# Altium footprint library chenjd.PcbLib: 87 footprints (part 3 of 6)
Each footprint in its own frame and in the unit in brackets; x right, y up, seen from the top. Pads: shape width x height; smd on the part's side, far side on the other; paste and mask are expansions set on the pad; w line width, h text height; cw(c..) or ccw(c..) is an arc to the next point about the centre after c.
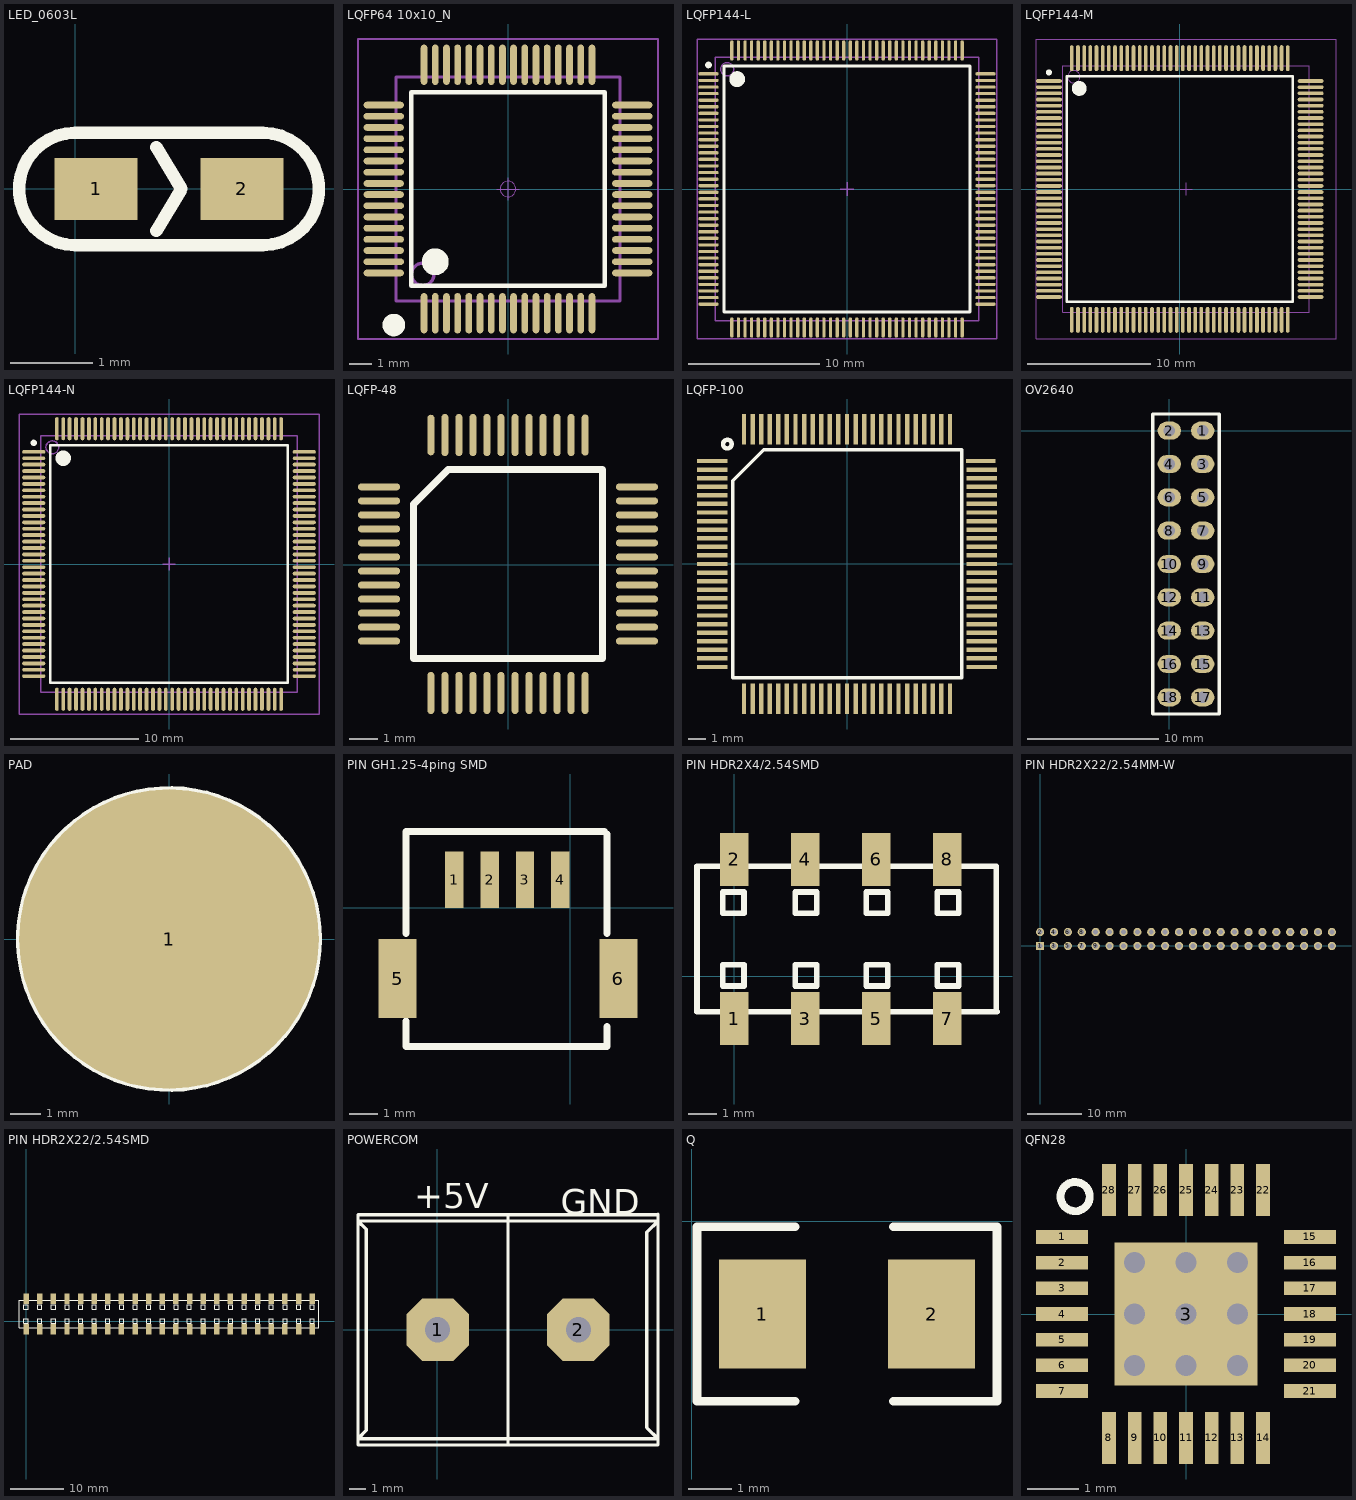
[diagram p2: the footprints below, top view; thin cyan lines are the x and y axes]

## LED_0603L [mil] "LED"
pads (2):
  rect 40x30 smd: 1(10,0) 2(80,0)
Top Overlay:
  lines w6: 39,-20 51,0 39,20 ; 0,-27 cw(c0,0) 0,27 90,27 cw(c90,0) 90,-27 0,-27
3D body "LED_0603_R.STEP": height 23.62, standoff -0.08, extent 13.51,-15.74 76.5,15.75

## LQFP64 10x10_N [mm] "64脚，体宽10x10mm，脚距0.5mm"
height 1.6
pads (64):
  oval 0.3x1.8 smd: 1(-3.75,-5.55) 2(-3.25,-5.55) 3(-2.75,-5.55) 4(-2.25,-5.55) 5(-1.75,-5.55) 6(-1.25,-5.55) 7(-0.75,-5.55) 8(-0.25,-5.55) 9(0.25,-5.55) 10(0.75,-5.55) 11(1.25,-5.55) 12(1.75,-5.55) 13(2.25,-5.55) 14(2.75,-5.55) 15(3.25,-5.55) 16(3.75,-5.55) 33(3.75,5.55) 34(3.25,5.55) 35(2.75,5.55) 36(2.25,5.55) 37(1.75,5.55) 38(1.25,5.55) 39(0.75,5.55) 40(0.25,5.55) 41(-0.25,5.55) 42(-0.75,5.55) 43(-1.25,5.55) 44(-1.75,5.55) 45(-2.25,5.55) 46(-2.75,5.55) 47(-3.25,5.55) 48(-3.75,5.55)
  oval 1.8x0.3 smd: 17(5.55,-3.75) 18(5.55,-3.25) 19(5.55,-2.75) 20(5.55,-2.25) 21(5.55,-1.75) 22(5.55,-1.25) 23(5.55,-0.75) 24(5.55,-0.25) 25(5.55,0.25) 26(5.55,0.75) 27(5.55,1.25) 28(5.55,1.75) 29(5.55,2.25) 30(5.55,2.75) 31(5.55,3.25) 32(5.55,3.75) 49(-5.55,3.75) 50(-5.55,3.25) 51(-5.55,2.75) 52(-5.55,2.25) 53(-5.55,1.75) 54(-5.55,1.25) 55(-5.55,0.75) 56(-5.55,0.25) 57(-5.55,-0.25) 58(-5.55,-0.75) 59(-5.55,-1.25) 60(-5.55,-1.75) 61(-5.55,-2.25) 62(-5.55,-2.75) 63(-5.55,-3.25) 64(-5.55,-3.75)
Top Overlay:
  circle w0.6: c-3.25,-3.25 r0.3
  circle w0.508: c-5.1,-6.076 r0.25
  lines w0.2: -4.318,-4.318 4.318,-4.318 4.318,4.318 -4.318,4.318 -4.318,-4.318
Mechanical 13:
  circle w0.15: c-3.81,-3.81 r0.5
  lines w0.15: -5,-5 -5,5 5,5 5,-5 -5,-5
Mechanical 15:
  circle w0.05: c0,0 r0.35
  lines w0.05: -0.5,0 0.5,0 ; 0,-0.5 0,0.5
  lines w0.1: -6.7,-6.7 6.7,-6.7 6.7,6.7 -6.7,6.7 -6.7,-6.7
3D body "LQFP64-10x10.STEP": height 1.45, standoff 0, extent -6,-6 6,6

## LQFP144-L [mm]
pads (144):
  oval 1.55x0.25 smd: 1(-10.525,8.75) 2(-10.525,8.25) 3(-10.525,7.75) 4(-10.525,7.25) 5(-10.525,6.75) 6(-10.525,6.25) 7(-10.525,5.75) 8(-10.525,5.25) 9(-10.525,4.75) 10(-10.525,4.25) 11(-10.525,3.75) 12(-10.525,3.25) 13(-10.525,2.75) 14(-10.525,2.25) 15(-10.525,1.75) 16(-10.525,1.25) 17(-10.525,0.75) 18(-10.525,0.25) 19(-10.525,-0.25) 20(-10.525,-0.75) 21(-10.525,-1.25) 22(-10.525,-1.75) 23(-10.525,-2.25) 24(-10.525,-2.75) 25(-10.525,-3.25) 26(-10.525,-3.75) 27(-10.525,-4.25) 28(-10.525,-4.75) 29(-10.525,-5.25) 30(-10.525,-5.75) 31(-10.525,-6.25) 32(-10.525,-6.75) 33(-10.525,-7.25) 34(-10.525,-7.75) 35(-10.525,-8.25) 36(-10.525,-8.75) 73(10.525,-8.75) 74(10.525,-8.25) 75(10.525,-7.75) 76(10.525,-7.25) 77(10.525,-6.75) 78(10.525,-6.25) 79(10.525,-5.75) 80(10.525,-5.25) 81(10.525,-4.75) 82(10.525,-4.25) 83(10.525,-3.75) 84(10.525,-3.25) 85(10.525,-2.75) 86(10.525,-2.25) 87(10.525,-1.75) 88(10.525,-1.25) 89(10.525,-0.75) 90(10.525,-0.25) 91(10.525,0.25) 92(10.525,0.75) 93(10.525,1.25) 94(10.525,1.75) 95(10.525,2.25) 96(10.525,2.75) 97(10.525,3.25) 98(10.525,3.75) 99(10.525,4.25) 100(10.525,4.75) 101(10.525,5.25) 102(10.525,5.75) 103(10.525,6.25) 104(10.525,6.75) 105(10.525,7.25) 106(10.525,7.75) 107(10.525,8.25) 108(10.525,8.75)
  oval 0.25x1.55 smd: 37(-8.75,-10.525) 38(-8.25,-10.525) 39(-7.75,-10.525) 40(-7.25,-10.525) 41(-6.75,-10.525) 42(-6.25,-10.525) 43(-5.75,-10.525) 44(-5.25,-10.525) 45(-4.75,-10.525) 46(-4.25,-10.525) 47(-3.75,-10.525) 48(-3.25,-10.525) 49(-2.75,-10.525) 50(-2.25,-10.525) 51(-1.75,-10.525) 52(-1.25,-10.525) 53(-0.75,-10.525) 54(-0.25,-10.525) 55(0.25,-10.525) 56(0.75,-10.525) 57(1.25,-10.525) 58(1.75,-10.525) 59(2.25,-10.525) 60(2.75,-10.525) 61(3.25,-10.525) 62(3.75,-10.525) 63(4.25,-10.525) 64(4.75,-10.525) 65(5.25,-10.525) 66(5.75,-10.525) 67(6.25,-10.525) 68(6.75,-10.525) 69(7.25,-10.525) 70(7.75,-10.525) 71(8.25,-10.525) 72(8.75,-10.525) 109(8.75,10.525) 110(8.25,10.525) 111(7.75,10.525) 112(7.25,10.525) 113(6.75,10.525) 114(6.25,10.525) 115(5.75,10.525) 116(5.25,10.525) 117(4.75,10.525) 118(4.25,10.525) 119(3.75,10.525) 120(3.25,10.525) 121(2.75,10.525) 122(2.25,10.525) 123(1.75,10.525) 124(1.25,10.525) 125(0.75,10.525) 126(0.25,10.525) 127(-0.25,10.525) 128(-0.75,10.525) 129(-1.25,10.525) 130(-1.75,10.525) 131(-2.25,10.525) 132(-2.75,10.525) 133(-3.25,10.525) 134(-3.75,10.525) 135(-4.25,10.525) 136(-4.75,10.525) 137(-5.25,10.525) 138(-5.75,10.525) 139(-6.25,10.525) 140(-6.75,10.525) 141(-7.25,10.525) 142(-7.75,10.525) 143(-8.25,10.525) 144(-8.75,10.525)
Top Overlay:
  circle w0.25: c-10.525,9.425 r0.125
  circle w0.6: c-8.35,8.35 r0.3
  lines w0.2: -9.35,-9.35 -9.35,9.35 9.35,9.35 9.35,-9.35 -9.35,-9.35
Mechanical 13:
  circle w0.1: c-9.1,9.1 r0.5
  lines w0.1: -10,-10 -10,10 10,10 10,-10 -10,-10
Mechanical 15:
  lines w0.1: -0.5,0 0.5,0 ; 0,-0.5 0,0.5 ; -11.4,-11.4 -11.4,11.4 11.4,11.4 11.4,-11.4 -11.4,-11.4

## LQFP144-M [mm]
pads (144):
  oval 2.1x0.3 smd: 1(-10.6,8.75) 2(-10.6,8.25) 3(-10.6,7.75) 4(-10.6,7.25) 5(-10.6,6.75) 6(-10.6,6.25) 7(-10.6,5.75) 8(-10.6,5.25) 9(-10.6,4.75) 10(-10.6,4.25) 11(-10.6,3.75) 12(-10.6,3.25) 13(-10.6,2.75) 14(-10.6,2.25) 15(-10.6,1.75) 16(-10.6,1.25) 17(-10.6,0.75) 18(-10.6,0.25) 19(-10.6,-0.25) 20(-10.6,-0.75) 21(-10.6,-1.25) 22(-10.6,-1.75) 23(-10.6,-2.25) 24(-10.6,-2.75) 25(-10.6,-3.25) 26(-10.6,-3.75) 27(-10.6,-4.25) 28(-10.6,-4.75) 29(-10.6,-5.25) 30(-10.6,-5.75) 31(-10.6,-6.25) 32(-10.6,-6.75) 33(-10.6,-7.25) 34(-10.6,-7.75) 35(-10.6,-8.25) 36(-10.6,-8.75) 73(10.6,-8.75) 74(10.6,-8.25) 75(10.6,-7.75) 76(10.6,-7.25) 77(10.6,-6.75) 78(10.6,-6.25) 79(10.6,-5.75) 80(10.6,-5.25) 81(10.6,-4.75) 82(10.6,-4.25) 83(10.6,-3.75) 84(10.6,-3.25) 85(10.6,-2.75) 86(10.6,-2.25) 87(10.6,-1.75) 88(10.6,-1.25) 89(10.6,-0.75) 90(10.6,-0.25) 91(10.6,0.25) 92(10.6,0.75) 93(10.6,1.25) 94(10.6,1.75) 95(10.6,2.25) 96(10.6,2.75) 97(10.6,3.25) 98(10.6,3.75) 99(10.6,4.25) 100(10.6,4.75) 101(10.6,5.25) 102(10.6,5.75) 103(10.6,6.25) 104(10.6,6.75) 105(10.6,7.25) 106(10.6,7.75) 107(10.6,8.25) 108(10.6,8.75)
  oval 0.3x2.1 smd: 37(-8.75,-10.6) 38(-8.25,-10.6) 39(-7.75,-10.6) 40(-7.25,-10.6) 41(-6.75,-10.6) 42(-6.25,-10.6) 43(-5.75,-10.6) 44(-5.25,-10.6) 45(-4.75,-10.6) 46(-4.25,-10.6) 47(-3.75,-10.6) 48(-3.25,-10.6) 49(-2.75,-10.6) 50(-2.25,-10.6) 51(-1.75,-10.6) 52(-1.25,-10.6) 53(-0.75,-10.6) 54(-0.25,-10.6) 55(0.25,-10.6) 56(0.75,-10.6) 57(1.25,-10.6) 58(1.75,-10.6) 59(2.25,-10.6) 60(2.75,-10.6) 61(3.25,-10.6) 62(3.75,-10.6) 63(4.25,-10.6) 64(4.75,-10.6) 65(5.25,-10.6) 66(5.75,-10.6) 67(6.25,-10.6) 68(6.75,-10.6) 69(7.25,-10.6) 70(7.75,-10.6) 71(8.25,-10.6) 72(8.75,-10.6) 109(8.75,10.6) 110(8.25,10.6) 111(7.75,10.6) 112(7.25,10.6) 113(6.75,10.6) 114(6.25,10.6) 115(5.75,10.6) 116(5.25,10.6) 117(4.75,10.6) 118(4.25,10.6) 119(3.75,10.6) 120(3.25,10.6) 121(2.75,10.6) 122(2.25,10.6) 123(1.75,10.6) 124(1.25,10.6) 125(0.75,10.6) 126(0.25,10.6) 127(-0.25,10.6) 128(-0.75,10.6) 129(-1.25,10.6) 130(-1.75,10.6) 131(-2.25,10.6) 132(-2.75,10.6) 133(-3.25,10.6) 134(-3.75,10.6) 135(-4.25,10.6) 136(-4.75,10.6) 137(-5.25,10.6) 138(-5.75,10.6) 139(-6.25,10.6) 140(-6.75,10.6) 141(-7.25,10.6) 142(-7.75,10.6) 143(-8.25,10.6) 144(-8.75,10.6)
Top Overlay:
  circle w0.6: c-8.15,8.15 r0.3
  circle w0.25: c-10.6,9.45 r0.125
  lines w0.2: -9.15,-9.15 9.15,-9.15 9.15,9.15 -9.15,9.15 -9.15,-9.15
Mechanical 13:
  circle w0.1: c-8.592,9.1 r0.5
  lines w0.1: -9.492,-10 10.508,-10 10.508,10 -9.492,10 -9.492,-10
Mechanical 15:
  lines w0.1: 0.008,0 1.008,0 ; 0.508,-0.5 0.508,0.5 ; -11.642,-12.15 12.658,-12.15 12.658,12.15 -11.642,12.15 -11.642,-12.15

## LQFP144-N [mm]
pads (144):
  oval 1.8x0.3 smd: 1(-10.55,8.75) 2(-10.55,8.25) 3(-10.55,7.75) 4(-10.55,7.25) 5(-10.55,6.75) 6(-10.55,6.25) 7(-10.55,5.75) 8(-10.55,5.25) 9(-10.55,4.75) 10(-10.55,4.25) 11(-10.55,3.75) 12(-10.55,3.25) 13(-10.55,2.75) 14(-10.55,2.25) 15(-10.55,1.75) 16(-10.55,1.25) 17(-10.55,0.75) 18(-10.55,0.25) 19(-10.55,-0.25) 20(-10.55,-0.75) 21(-10.55,-1.25) 22(-10.55,-1.75) 23(-10.55,-2.25) 24(-10.55,-2.75) 25(-10.55,-3.25) 26(-10.55,-3.75) 27(-10.55,-4.25) 28(-10.55,-4.75) 29(-10.55,-5.25) 30(-10.55,-5.75) 31(-10.55,-6.25) 32(-10.55,-6.75) 33(-10.55,-7.25) 34(-10.55,-7.75) 35(-10.55,-8.25) 36(-10.55,-8.75) 73(10.55,-8.75) 74(10.55,-8.25) 75(10.55,-7.75) 76(10.55,-7.25) 77(10.55,-6.75) 78(10.55,-6.25) 79(10.55,-5.75) 80(10.55,-5.25) 81(10.55,-4.75) 82(10.55,-4.25) 83(10.55,-3.75) 84(10.55,-3.25) 85(10.55,-2.75) 86(10.55,-2.25) 87(10.55,-1.75) 88(10.55,-1.25) 89(10.55,-0.75) 90(10.55,-0.25) 91(10.55,0.25) 92(10.55,0.75) 93(10.55,1.25) 94(10.55,1.75) 95(10.55,2.25) 96(10.55,2.75) 97(10.55,3.25) 98(10.55,3.75) 99(10.55,4.25) 100(10.55,4.75) 101(10.55,5.25) 102(10.55,5.75) 103(10.55,6.25) 104(10.55,6.75) 105(10.55,7.25) 106(10.55,7.75) 107(10.55,8.25) 108(10.55,8.75)
  oval 0.3x1.8 smd: 37(-8.75,-10.55) 38(-8.25,-10.55) 39(-7.75,-10.55) 40(-7.25,-10.55) 41(-6.75,-10.55) 42(-6.25,-10.55) 43(-5.75,-10.55) 44(-5.25,-10.55) 45(-4.75,-10.55) 46(-4.25,-10.55) 47(-3.75,-10.55) 48(-3.25,-10.55) 49(-2.75,-10.55) 50(-2.25,-10.55) 51(-1.75,-10.55) 52(-1.25,-10.55) 53(-0.75,-10.55) 54(-0.25,-10.55) 55(0.25,-10.55) 56(0.75,-10.55) 57(1.25,-10.55) 58(1.75,-10.55) 59(2.25,-10.55) 60(2.75,-10.55) 61(3.25,-10.55) 62(3.75,-10.55) 63(4.25,-10.55) 64(4.75,-10.55) 65(5.25,-10.55) 66(5.75,-10.55) 67(6.25,-10.55) 68(6.75,-10.55) 69(7.25,-10.55) 70(7.75,-10.55) 71(8.25,-10.55) 72(8.75,-10.55) 109(8.75,10.55) 110(8.25,10.55) 111(7.75,10.55) 112(7.25,10.55) 113(6.75,10.55) 114(6.25,10.55) 115(5.75,10.55) 116(5.25,10.55) 117(4.75,10.55) 118(4.25,10.55) 119(3.75,10.55) 120(3.25,10.55) 121(2.75,10.55) 122(2.25,10.55) 123(1.75,10.55) 124(1.25,10.55) 125(0.75,10.55) 126(0.25,10.55) 127(-0.25,10.55) 128(-0.75,10.55) 129(-1.25,10.55) 130(-1.75,10.55) 131(-2.25,10.55) 132(-2.75,10.55) 133(-3.25,10.55) 134(-3.75,10.55) 135(-4.25,10.55) 136(-4.75,10.55) 137(-5.25,10.55) 138(-5.75,10.55) 139(-6.25,10.55) 140(-6.75,10.55) 141(-7.25,10.55) 142(-7.75,10.55) 143(-8.25,10.55) 144(-8.75,10.55)
Top Overlay:
  circle w0.6: c-8.25,8.25 r0.3
  circle w0.25: c-10.55,9.45 r0.125
  lines w0.2: -9.25,-9.25 9.25,-9.25 9.25,9.25 -9.25,9.25 -9.25,-9.25
Mechanical 13:
  circle w0.1: c-9.1,9.1 r0.5
  lines w0.1: -10,-10 10,-10 10,10 -10,10 -10,-10
Mechanical 15:
  lines w0.1: -0.5,0 0.5,0 ; 0,-0.5 0,0.5 ; -11.7,-11.7 11.7,-11.7 11.7,11.7 -11.7,11.7 -11.7,-11.7

## LQFP-48 [mm] "GD105"
pads (48):
  oval 1.5x0.25 smd: 1(-4.6,2.773) 2(-4.6,2.273) 3(-4.6,1.773) 4(-4.6,1.273) 5(-4.6,0.773) 6(-4.6,0.273) 7(-4.6,-0.227) 8(-4.6,-0.727) 9(-4.6,-1.227) 10(-4.6,-1.727) 11(-4.6,-2.227) 12(-4.6,-2.727) 25(4.6,-2.727) 26(4.6,-2.227) 27(4.6,-1.727) 28(4.6,-1.227) 29(4.6,-0.727) 30(4.6,-0.227) 31(4.6,0.273) 32(4.6,0.773) 33(4.6,1.273) 34(4.6,1.773) 35(4.6,2.273) 36(4.6,2.773)
  oval 0.25x1.5 smd: 13(-2.75,-4.577) 14(-2.25,-4.577) 15(-1.75,-4.577) 16(-1.25,-4.577) 17(-0.75,-4.577) 18(-0.25,-4.577) 19(0.25,-4.577) 20(0.75,-4.577) 21(1.25,-4.577) 22(1.75,-4.577) 23(2.25,-4.577) 24(2.75,-4.577) 38(2.25,4.623) 39(1.75,4.623) 40(1.25,4.623) 41(0.75,4.623) 42(0.25,4.623) 43(-0.25,4.623) 44(-0.75,4.623) 45(-1.25,4.623) 46(-1.75,4.623) 47(-2.25,4.623)
  oval 0.25x1.473 smd: 37(2.75,4.623)
  oval 0.25x1.448 smd: 48(-2.75,4.623)
Top Overlay:
  lines w0.254: -3.365,-3.342 -3.365,2.153 -2.13,3.388 3.365,3.388 3.365,-3.342 -3.365,-3.342
3D body "LQFP48-7x7.STEP": height 1.45, standoff 0, extent -4.5,-4.5 4.5,4.5

## LQFP-100 [mil]
pads (100):
  rect 70x10 smd: 1(-309.5,236.22) 2(-309.5,216.53) 3(-309.5,196.85) 4(-309.5,177.16) 5(-309.5,157.48) 6(-309.5,137.79) 7(-309.5,118.11) 8(-309.5,98.42) 9(-309.5,78.74) 10(-309.5,59.05) 11(-309.5,39.37) 12(-309.5,19.68) 13(-309.5,0) 14(-309.5,-19.69) 15(-309.5,-39.37) 16(-309.5,-59.06) 17(-309.5,-78.74) 18(-309.5,-98.43) 19(-309.5,-118.11) 20(-309.5,-137.8) 21(-309.5,-157.48) 22(-309.5,-177.17) 23(-309.5,-196.85) 24(-309.5,-216.54) 25(-309.5,-236.22) 51(308.61,-236.22) 52(308.61,-216.54) 53(308.61,-196.85) 54(308.61,-177.17) 55(308.61,-157.48) 56(308.61,-137.8) 57(308.61,-118.11) 58(308.61,-98.43) 59(308.61,-78.74) 60(308.61,-59.06) 61(308.61,-39.37) 62(308.61,-19.69) 63(308.61,0) 64(308.61,19.68) 65(308.61,39.37) 66(308.61,59.05) 67(308.61,78.74) 68(308.61,98.42) 69(308.61,118.11) 70(308.61,137.79) 71(308.61,157.48) 72(308.61,177.16) 73(308.61,196.85) 74(308.61,216.53)
  rect 10x70 smd: 26(-236.67,-309.06) 27(-216.98,-309.06) 28(-197.29,-309.06) 29(-177.61,-309.06) 30(-157.93,-309.06) 31(-138.24,-309.06) 32(-118.56,-309.06) 33(-98.87,-309.06) 34(-79.19,-309.06) 35(-59.5,-309.06) 36(-39.81,-309.06) 37(-20.13,-309.06) 38(-0.45,-309.06) 39(19.24,-309.06) 40(38.92,-309.06) 41(58.61,-309.06) 42(78.3,-309.06) 43(97.98,-309.06) 44(117.67,-309.06) 45(137.35,-309.06) 46(157.03,-309.06) 47(176.72,-309.06) 48(196.41,-309.06) 49(216.09,-309.06) 50(235.78,-309.06) 76(235.78,309.05) 77(216.09,309.05) 78(196.41,309.05) 79(176.72,309.05) 80(157.04,309.05) 81(137.35,309.05) 82(117.67,309.05) 83(97.98,309.05) 84(78.3,309.05) 85(58.61,309.05) 86(38.93,309.05) 87(19.24,309.05) 88(-0.44,309.05) 89(-20.13,309.05) 90(-39.81,309.05) 91(-59.5,309.05) 92(-79.18,309.05) 93(-98.87,309.05) 94(-118.55,309.05) 95(-138.24,309.05) 96(-157.93,309.05) 97(-177.61,309.05) 98(-197.29,309.05) 99(-216.98,309.05) 100(-236.66,309.05)
  rect 68x10 smd: 75(306.61,236.22)
Top Overlay:
  circle w10: c-275,275 r10
  lines w8: -262.26,191.22 -262.26,-260.95 263.02,-260.95 263.02,261.81 -191.5,261.81 -262.09,191.22
3D body "LQFP100 14x14.STEP": height 57.09, standoff 0.03, extent -315.52,-321.09 314.63,309.05

## OV2640 [mil] "CAMERA接口"
pads (18):
  oval 70x54 hole 35: 1(99.66,0.01) 2(-0.34,0.01) 3(99.66,-99.99) 4(-0.34,-99.99) 5(99.66,-199.99) 6(-0.34,-199.99) 7(99.66,-299.99) 8(-0.34,-299.99) 9(99.66,-399.99) 10(-0.34,-399.99) 11(99.66,-499.99) 12(-0.34,-499.99) 13(99.66,-599.99) 14(-0.34,-599.99) 15(99.66,-699.99) 16(-0.34,-699.99) 17(99.66,-799.99) 18(-0.34,-799.99)
Top Overlay:
  lines w10: -50.34,-849.99 -50.34,50.01 149.66,50.01 149.66,-849.99 -50.34,-849.99
3D body "4PIN--yellow.STEP": height 452.76, standoff -118.11, extent 49.66,-350 149.66,50
3D body "4PIN--yellow.STEP": height 452.76, standoff -118.11, extent 49.66,-750 149.66,-350
3D body "4PIN--yellow.STEP": height 452.76, standoff -118.11, extent -50.34,-350 49.66,50
3D body "4PIN--yellow.STEP": height 452.76, standoff -118.11, extent -50.34,-750 49.66,-350

## PAD [mm] "触摸"
pads (1):
  round 10 smd: 1(0,0)
Top Overlay:
  circle w0.2: c0,0 r5

## PIN GH1.25-4ping SMD [mm] "GH1.25 4pin"
pads (6):
  rect 0.65x2 smd: 1(-4.1,1) 2(-2.85,1) 3(-1.6,1) 4(-0.35,1)
  rect 1.35x2.8 smd: 5(-6.1,-2.5) 6(1.7,-2.5)
Top Overlay:
  lines w0.2: 1.2,2.7 1.3,2.6
  lines w0.254: -5.8,-4 -5.8,-4.9 1.3,-4.9 1.3,-4.2 ; -5.8,-0.9 -5.8,2.7 1.2,2.7 ; 1.3,-0.9 1.3,2.6

## PIN HDR2X4/2.54SMD [mm] "4pin双排2.54贴片"
pads (8):
  rect 1.02x1.9 smd: 1(0,-1.524) 2(0,4.176) 3(2.54,-1.524) 4(2.54,4.176) 5(5.08,-1.524) 6(5.08,4.176) 7(7.62,-1.524) 8(7.62,4.176)
Top Overlay:
  lines w0.2: 9.3,3.926 -1.33,3.926 -1.33,-1.274 9.4,-1.274 ; 9.37,-1.274 9.37,3.926 ; -0.411,-0.355 -0.411,0.407 0.351,0.407 0.351,-0.355 -0.411,-0.355 ; -0.411,2.245 -0.411,3.007 0.351,3.007 0.351,2.245 -0.411,2.245 ; 2.189,-0.355 2.189,0.407 2.951,0.407 2.951,-0.355 2.189,-0.355 ; 2.189,2.245 2.189,3.007 2.951,3.007 2.951,2.245 2.189,2.245 ; 4.729,-0.355 5.491,-0.355 5.491,0.407 4.729,0.407 4.729,-0.355 ; 4.729,2.245 5.491,2.245 5.491,3.007 4.729,3.007 4.729,2.245 ; 7.269,-0.355 7.269,0.407 8.031,0.407 8.031,-0.355 7.269,-0.355 ; 7.269,2.245 7.269,3.007 8.031,3.007 8.031,2.245 7.269,2.245
3D body "Fe-Header2X1.STEP": height 5.15, standoff 0, extent 3.81,-1.778 6.41,4.622
3D body "Fe-Header2X1.STEP": height 5.15, standoff 0, extent 1.27,-1.778 3.87,4.622
3D body "Fe-Header2X1.STEP": height 5.15, standoff 0, extent -1.27,-1.778 1.33,4.622
3D body "Fe-Header2X1.STEP": height 5.15, standoff 0, extent 6.35,-1.778 8.95,4.622

## PIN HDR2X22/2.54MM-W [mm] "22pin双排，直插"
pads (44):
  rect 1.5x1.5 hole 0.9: 1(0,0)
  round 1.5 hole 0.9: 2(0,2.54) 3(2.54,0) 4(2.54,2.54) 5(5.08,0) 6(5.08,2.54) 7(7.62,0) 8(7.62,2.54) 9(10.16,0) 10(10.16,2.54) 11(12.7,0) 12(12.7,2.54) 13(15.24,0) 14(15.24,2.54) 15(17.78,0) 16(17.78,2.54) 17(20.32,0) 18(20.32,2.54) 19(22.86,0) 20(22.86,2.54) 21(25.4,0) 22(25.4,2.54) 23(27.94,0) 24(27.94,2.54) 25(30.48,0) 26(30.48,2.54) 27(33.02,0) 28(33.02,2.54) 29(35.56,0) 30(35.56,2.54) 31(38.1,0) 32(38.1,2.54) 33(40.64,0) 34(40.64,2.54) 35(43.18,0) 36(43.18,2.54) 37(45.72,0) 38(45.72,2.54) 39(48.26,0) 40(48.26,2.54) 41(50.8,0) 42(50.8,2.54) 43(53.34,0) 44(53.34,2.54)
3D body "HEADER.STEP": height 7.58, standoff -2.94, extent 52.07,1.27 54.61,3.81
3D body "HEADER.STEP": height 7.58, standoff -2.94, extent 49.53,1.27 52.07,3.81
3D body "HEADER.STEP": height 7.58, standoff -2.94, extent 52.07,-1.27 54.61,1.27
3D body "HEADER.STEP": height 7.58, standoff -2.94, extent 49.53,-1.27 52.07,1.27
3D body "HEADER.STEP": height 7.58, standoff -2.94, extent 46.99,1.27 49.53,3.81
3D body "HEADER.STEP": height 7.58, standoff -2.94, extent 44.45,1.27 46.99,3.81
3D body "HEADER.STEP": height 7.58, standoff -2.94, extent 41.91,1.27 44.45,3.81
3D body "HEADER.STEP": height 7.58, standoff -2.94, extent 39.37,1.27 41.91,3.81
3D body "HEADER.STEP": height 7.58, standoff -2.94, extent 46.99,-1.27 49.53,1.27
3D body "HEADER.STEP": height 7.58, standoff -2.94, extent 44.45,-1.27 46.99,1.27
3D body "HEADER.STEP": height 7.58, standoff -2.94, extent 41.91,-1.27 44.45,1.27
3D body "HEADER.STEP": height 7.58, standoff -2.94, extent 39.37,-1.27 41.91,1.27
3D body "HEADER.STEP": height 7.58, standoff -2.94, extent 36.83,1.27 39.37,3.81
3D body "HEADER.STEP": height 7.58, standoff -2.94, extent 34.29,1.27 36.83,3.81
3D body "HEADER.STEP": height 7.58, standoff -2.94, extent 31.75,1.27 34.29,3.81
3D body "HEADER.STEP": height 7.58, standoff -2.94, extent 29.21,1.27 31.75,3.81
3D body "HEADER.STEP": height 7.58, standoff -2.94, extent 36.83,-1.27 39.37,1.27
3D body "HEADER.STEP": height 7.58, standoff -2.94, extent 34.29,-1.27 36.83,1.27
3D body "HEADER.STEP": height 7.58, standoff -2.94, extent 31.75,-1.27 34.29,1.27
3D body "HEADER.STEP": height 7.58, standoff -2.94, extent 29.21,-1.27 31.75,1.27
3D body "HEADER.STEP": height 7.58, standoff -2.94, extent 26.67,1.27 29.21,3.81
3D body "HEADER.STEP": height 7.58, standoff -2.94, extent 24.13,1.27 26.67,3.81
3D body "HEADER.STEP": height 7.58, standoff -2.94, extent 21.59,1.27 24.13,3.81
3D body "HEADER.STEP": height 7.58, standoff -2.94, extent 19.05,1.27 21.59,3.81
3D body "HEADER.STEP": height 7.58, standoff -2.94, extent 26.67,-1.27 29.21,1.27
3D body "HEADER.STEP": height 7.58, standoff -2.94, extent 24.13,-1.27 26.67,1.27
3D body "HEADER.STEP": height 7.58, standoff -2.94, extent 21.59,-1.27 24.13,1.27
3D body "HEADER.STEP": height 7.58, standoff -2.94, extent 19.05,-1.27 21.59,1.27
3D body "HEADER.STEP": height 7.58, standoff -2.94, extent 16.51,1.27 19.05,3.81
3D body "HEADER.STEP": height 7.58, standoff -2.94, extent 13.97,1.27 16.51,3.81
3D body "HEADER.STEP": height 7.58, standoff -2.94, extent 11.43,1.27 13.97,3.81
3D body "HEADER.STEP": height 7.58, standoff -2.94, extent 8.89,1.27 11.43,3.81
3D body "HEADER.STEP": height 7.58, standoff -2.94, extent 16.51,-1.27 19.05,1.27
3D body "HEADER.STEP": height 7.58, standoff -2.94, extent 13.97,-1.27 16.51,1.27
3D body "HEADER.STEP": height 7.58, standoff -2.94, extent 11.43,-1.27 13.97,1.27
3D body "HEADER.STEP": height 7.58, standoff -2.94, extent 8.89,-1.27 11.43,1.27
3D body "HEADER.STEP": height 7.58, standoff -2.94, extent -1.27,-1.27 1.27,1.27
3D body "HEADER.STEP": height 7.58, standoff -2.94, extent 1.27,-1.27 3.81,1.27
3D body "HEADER.STEP": height 7.58, standoff -2.94, extent 3.81,-1.27 6.35,1.27
3D body "HEADER.STEP": height 7.58, standoff -2.94, extent 6.35,-1.27 8.89,1.27
3D body "HEADER.STEP": height 7.58, standoff -2.94, extent -1.27,1.27 1.27,3.81
3D body "HEADER.STEP": height 7.58, standoff -2.94, extent 1.27,1.27 3.81,3.81
3D body "HEADER.STEP": height 7.58, standoff -2.94, extent 3.81,1.27 6.35,3.81
3D body "HEADER.STEP": height 7.58, standoff -2.94, extent 6.35,1.27 8.89,3.81

## PIN HDR2X22/2.54SMD [mm] "22pin双排2.54贴片"
pads (44):
  rect 1.02x1.9 smd: 1(0,-1.524) 2(0,4.176) 3(2.54,-1.524) 4(2.54,4.176) 5(5.08,-1.524) 6(5.08,4.176) 7(7.62,-1.524) 8(7.62,4.176) 9(10.16,-1.524) 10(10.16,4.176) 11(12.7,-1.524) 12(12.7,4.176) 13(15.24,-1.524) 14(15.24,4.176) 15(17.78,-1.524) 16(17.78,4.176) 17(20.32,-1.524) 18(20.32,4.176) 19(22.86,-1.524) 20(22.86,4.176) 21(25.4,-1.524) 22(25.4,4.176) 23(27.94,-1.524) 24(27.94,4.176) 25(30.48,-1.524) 26(30.48,4.176) 27(33.02,-1.524) 28(33.02,4.176) 29(35.56,-1.524) 30(35.56,4.176) 31(38.1,-1.524) 32(38.1,4.176) 33(40.64,-1.524) 34(40.64,4.176) 35(43.18,-1.524) 36(43.18,4.176) 37(45.72,-1.524) 38(45.72,4.176) 39(48.26,-1.524) 40(48.26,4.176) 41(50.8,-1.524) 42(50.8,4.176) 43(53.34,-1.524) 44(53.34,4.176)
Top Overlay:
  drawing of 180 lines, arcs and shapes, not listed
3D body "Fe-Header2X1.STEP": height 5.15, standoff 0, extent 49.53,-1.778 52.13,4.622
3D body "Fe-Header2X1.STEP": height 5.15, standoff 0, extent 46.99,-1.778 49.59,4.622
3D body "Fe-Header2X1.STEP": height 5.15, standoff 0, extent 44.45,-1.778 47.05,4.622
3D body "Fe-Header2X1.STEP": height 5.15, standoff 0, extent 52.07,-1.778 54.67,4.622
3D body "Fe-Header2X1.STEP": height 5.15, standoff 0, extent 34.29,-1.778 36.89,4.622
3D body "Fe-Header2X1.STEP": height 5.15, standoff 0, extent 31.75,-1.778 34.35,4.622
3D body "Fe-Header2X1.STEP": height 5.15, standoff 0, extent 29.21,-1.778 31.81,4.622
3D body "Fe-Header2X1.STEP": height 5.15, standoff 0, extent 39.37,-1.778 41.97,4.622
3D body "Fe-Header2X1.STEP": height 5.15, standoff 0, extent 36.83,-1.778 39.43,4.622
3D body "Fe-Header2X1.STEP": height 5.15, standoff 0, extent 41.91,-1.778 44.51,4.622
3D body "Fe-Header2X1.STEP": height 5.15, standoff 0, extent 19.05,-1.778 21.65,4.622
3D body "Fe-Header2X1.STEP": height 5.15, standoff 0, extent 16.51,-1.778 19.11,4.622
3D body "Fe-Header2X1.STEP": height 5.15, standoff 0, extent 13.97,-1.778 16.57,4.622
3D body "Fe-Header2X1.STEP": height 5.15, standoff 0, extent 24.13,-1.778 26.73,4.622
3D body "Fe-Header2X1.STEP": height 5.15, standoff 0, extent 21.59,-1.778 24.19,4.622
3D body "Fe-Header2X1.STEP": height 5.15, standoff 0, extent 26.67,-1.778 29.27,4.622
3D body "Fe-Header2X1.STEP": height 5.15, standoff 0, extent 3.81,-1.778 6.41,4.622
3D body "Fe-Header2X1.STEP": height 5.15, standoff 0, extent 1.27,-1.778 3.87,4.622
3D body "Fe-Header2X1.STEP": height 5.15, standoff 0, extent -1.27,-1.778 1.33,4.622
3D body "Fe-Header2X1.STEP": height 5.15, standoff 0, extent 8.89,-1.778 11.49,4.622
3D body "Fe-Header2X1.STEP": height 5.15, standoff 0, extent 6.35,-1.778 8.95,4.622
3D body "Fe-Header2X1.STEP": height 5.15, standoff 0, extent 11.43,-1.778 14.03,4.622

## POWERCOM [mil] "power接口"
pads (2):
  oct 150x150 hole 60: 1(0.84,-0.47) 2(336.85,-0.47)
Top Overlay:
  lines w8: -179.49,-250.9 -189.49,-260.9 ; -179.49,249.1 -189.49,259.1 ; 168.84,-275.9 168.84,274.1 ; 526.33,-275.9 -189.49,-275.9 -189.49,274.1 526.33,274.1 ; 527.17,-275.05 527.17,274.95 ; -189.49,-260.9 527.17,-260.9 500.51,-234.24 500.51,-220.9 500.51,232.44 527.17,259.1 -189.49,259.1 ; -189.49,-260.9 -169.49,-240.9 -169.49,239.1 -189.49,259.1
  text "GND" at 295,275 h60
  text "+5V" at -55,290 h60
Bottom Overlay:
  text "GND" at 500,110 h80
  text "+5V" at -85,110 h80
3D body "零件1.STEP": height 488.19, standoff -248.03, extent -124.99,-246.21 475.01,226.23

## Q [mil] "TVS二极管"
pads (2):
  rect 80x100 smd: 1(65.03,-85) 2(220.03,-85)
Top Overlay:
  lines w8: 95.03,-165 5.03,-165 5.03,-5 95.03,-5 ; 185.03,-165 280.03,-165 280.03,-5 185.03,-5
3D body "SW3dPS-DO-214AC SMA.STEP": height 94.69, standoff 0, extent 37.64,-136.18 242.36,-33.82

## QFN28 [mil] "QFN28"
pads (29):
  rect 40x10.5 smd: 1(-95,59.06) 2(-95,39.37) 3(-95,19.69) 4(-95,0) 5(-95,-19.68) 6(-95,-39.37) 7(-95,-59.05) 15(95,59.06) 16(95,39.37) 17(95,19.69) 18(95,0) 19(95,-19.68) 20(95,-39.37) 21(95,-59.05)
  rect 110x110 smd: 3(0,0)
  rect 10.5x40 smd: 8(-59.06,-95) 9(-39.37,-95) 10(-19.68,-95) 11(0,-95) 12(19.69,-95) 13(39.37,-95) 14(59.06,-95) 22(59.06,95) 23(39.37,95) 24(19.69,95) 25(0,95) 26(-19.68,95) 27(-39.37,95) 28(-59.06,95)
via 0,39.37 diameter 25 hole 16
via 0,-39.37 diameter 25 hole 16
via -39.37,39.37 diameter 25 hole 16
via -39.37,-39.37 diameter 25 hole 16
via 39.37,-39.37 diameter 25 hole 16
via 0,0 diameter 25 hole 16
via -39.37,0 diameter 25 hole 16
via 39.37,0 diameter 25 hole 16
via 39.37,39.37 diameter 25 hole 16
Top Overlay:
  circle w6: c-85,90 r11.18
3D body "SW3dPS-QFN-28.STEP": height 40.26, standoff -3.3, extent -118.11,-120 118.11,116.22